# Altium integrated library ubloxLib.IntLib: 111 symbols (part 3 of 4) (continued)
## NORA-W40x (continued)
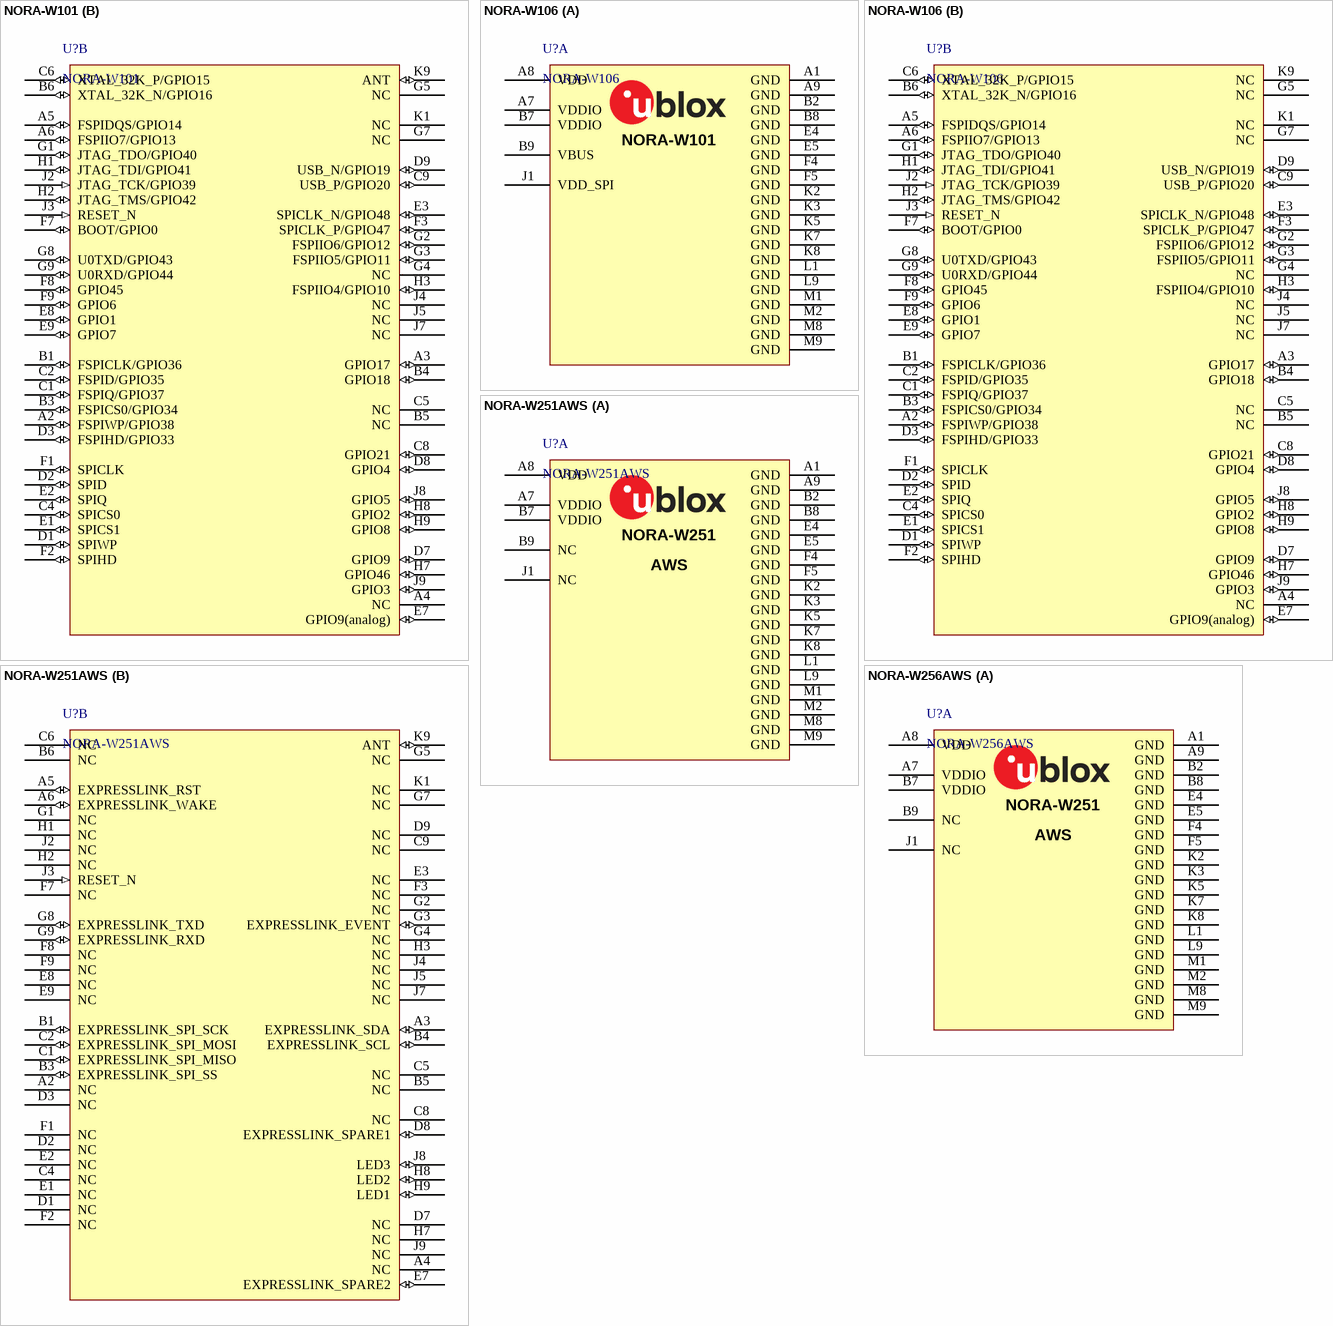
[diagram p17: symbols NORA-W101 to NORA-W256AWS]
text: NORA-MODULE

## NORA-W101
designator U?
u-blox NORA-W101 Bluetooth LE and Wi-Fi module - antenna pin; Manufacturer P/N: NORA-B101-00B; Part Number: NORA-B101; Part Description: Stand-alone Bluetooth low energy module - dual-core; Body Size: 14.3 mm x 10.4 mm; Part Name: NORA-B101; Part_Type: Module; Manufacturer: u-blox; Height: 1.8 mm; Value: NORA-W101
footprint NORA_LGA82R_1430X1040X190_PIN (NORA LGA, 82pin ,1.1mm Pitch, 14.3mm x 10.4mm x 1.9mm)
part A pins: A1 GND (power), A7 VDDIO (power), A8 VDD (power), A9 GND (power), B2 GND (power), B7 VDDIO (power), B8 GND (power), B9 VBUS (power), E4 GND (power), E5 GND (power), F4 GND (power), F5 GND (power), J1 VDD_SPI (power), K2 GND (power), K3 GND (power), K5 GND (power), K7 GND (power), K8 GND (power), L1 GND (power), L9 GND (power), M1 GND (power), M2 GND (power), M8 GND (power), M9 GND (power)
part B pins: A2 FSPIWP/GPIO38 (io), A3 GPIO17 (io), A4 NC, A5 FSPIDQS/GPIO14 (io), A6 FSPIIO7/GPIO13 (io), B1 FSPICLK/GPIO36 (io), B3 FSPICS0/GPIO34 (io), B4 GPIO18 (io), B5 NC, B6 XTAL_32K_N/GPIO16 (io), C1 FSPIQ/GPIO37 (io), C2 FSPID/GPIO35 (io), C4 SPICS0 (io), C5 NC, C6 XTAL_32K_P/GPIO15 (io), C8 GPIO21 (io), C9 USB_P/GPIO20 (io), D1 SPIWP (io), D2 SPID (io), D3 FSPIHD/GPIO33 (io), D7 GPIO9 (io), D8 GPIO4 (io), D9 USB_N/GPIO19 (io), E1 SPICS1 (io), E2 SPIQ (io), E3 SPICLK_N/GPIO48 (io), E7 GPIO9(analog) (io), E8 GPIO1 (io), E9 GPIO7 (io), F1 SPICLK (io), F2 SPIHD (io), F3 SPICLK_P/GPIO47 (io), F7 BOOT/GPIO0 (io), F8 GPIO45 (io), F9 GPIO6 (io), G1 JTAG_TDO/GPIO40 (io), G2 FSPIIO6/GPIO12 (io), G3 FSPIIO5/GPIO11 (io), G4 NC, G5 NC, G7 NC, G8 U0TXD/GPIO43 (io), G9 U0RXD/GPIO44 (io), H1 JTAG_TDI/GPIO41 (io), H2 JTAG_TMS/GPIO42 (io), H3 FSPIIO4/GPIO10 (io), H7 GPIO46 (io), H8 GPIO2 (io), H9 GPIO8 (io), J2 JTAG_TCK/GPIO39 (in), J3 RESET_N (in), J4 NC, J5 NC, J7 NC, J8 GPIO5 (io), J9 GPIO3 (io), K1 NC, K9 ANT (io)

## NORA-W106
designator U?
u-blox NORA-W106 Bluetooth LE and Wi-Fi module - PCB antenna; Manufacturer P/N: NORA-B101-00B; Part Number: NORA-B101; Part Description: Stand-alone Bluetooth low energy module - dual-core; Body Size: 14.3 mm x 10.4 mm; Value: NORA-W101; Part Name: NORA-B101; Part_Type: Module; Manufacturer: u-blox; Height: 1.8 mm
footprint NORA_LGA82R_1430X1040X190_ANT (NORA LGA, 82pin ,1.1mm Pitch, 14.3mm x 10.4mm x 1.9mm)
part A pins: A1 GND (power), A7 VDDIO (power), A8 VDD (power), A9 GND (power), B2 GND (power), B7 VDDIO (power), B8 GND (power), B9 VBUS (power), E4 GND (power), E5 GND (power), F4 GND (power), F5 GND (power), J1 VDD_SPI (power), K2 GND (power), K3 GND (power), K5 GND (power), K7 GND (power), K8 GND (power), L1 GND (power), L9 GND (power), M1 GND (power), M2 GND (power), M8 GND (power), M9 GND (power)
part B pins: A2 FSPIWP/GPIO38 (io), A3 GPIO17 (io), A4 NC, A5 FSPIDQS/GPIO14 (io), A6 FSPIIO7/GPIO13 (io), B1 FSPICLK/GPIO36 (io), B3 FSPICS0/GPIO34 (io), B4 GPIO18 (io), B5 NC, B6 XTAL_32K_N/GPIO16 (io), C1 FSPIQ/GPIO37 (io), C2 FSPID/GPIO35 (io), C4 SPICS0 (io), C5 NC, C6 XTAL_32K_P/GPIO15 (io), C8 GPIO21 (io), C9 USB_P/GPIO20 (io), D1 SPIWP (io), D2 SPID (io), D3 FSPIHD/GPIO33 (io), D7 GPIO9 (io), D8 GPIO4 (io), D9 USB_N/GPIO19 (io), E1 SPICS1 (io), E2 SPIQ (io), E3 SPICLK_N/GPIO48 (io), E7 GPIO9(analog) (io), E8 GPIO1 (io), E9 GPIO7 (io), F1 SPICLK (io), F2 SPIHD (io), F3 SPICLK_P/GPIO47 (io), F7 BOOT/GPIO0 (io), F8 GPIO45 (io), F9 GPIO6 (io), G1 JTAG_TDO/GPIO40 (io), G2 FSPIIO6/GPIO12 (io), G3 FSPIIO5/GPIO11 (io), G4 NC, G5 NC, G7 NC, G8 U0TXD/GPIO43 (io), G9 U0RXD/GPIO44 (io), H1 JTAG_TDI/GPIO41 (io), H2 JTAG_TMS/GPIO42 (io), H3 FSPIIO4/GPIO10 (io), H7 GPIO46 (io), H8 GPIO2 (io), H9 GPIO8 (io), J2 JTAG_TCK/GPIO39 (in), J3 RESET_N (in), J4 NC, J5 NC, J7 NC, J8 GPIO5 (io), J9 GPIO3 (io), K1 NC, K9 NC

## NORA-W251AWS
designator U?
u-blox NORA-W251AWS Bluetooth LE and Wi-Fi module - antenna pin; Manufacturer P/N: NORA-B101-00B; Part Number: NORA-B101; Part Description: Stand-alone Bluetooth low energy module - dual-core; Body Size: 14.3 mm x 10.4 mm; Value: NORA-W101; Part Name: NORA-B101; Part_Type: Module; Manufacturer: u-blox; Height: 1.8 mm
footprint NORA_LGA82R_1430X1040X190_PIN (NORA LGA, 82pin ,1.1mm Pitch, 14.3mm x 10.4mm x 1.9mm)
part A pins: A1 GND (power), A7 VDDIO (power), A8 VDD (power), A9 GND (power), B2 GND (power), B7 VDDIO (power), B8 GND (power), B9 NC, E4 GND (power), E5 GND (power), F4 GND (power), F5 GND (power), J1 NC, K2 GND (power), K3 GND (power), K5 GND (power), K7 GND (power), K8 GND (power), L1 GND (power), L9 GND (power), M1 GND (power), M2 GND (power), M8 GND (power), M9 GND (power)
part B pins: A2 NC, A3 EXPRESSLINK_SDA (io), A4 NC, A5 EXPRESSLINK_RST (io), A6 EXPRESSLINK_WAKE (io), B1 EXPRESSLINK_SPI_SCK (io), B3 EXPRESSLINK_SPI_SS (io), B4 EXPRESSLINK_SCL (io), B5 NC, B6 NC, C1 EXPRESSLINK_SPI_MISO (io), C2 EXPRESSLINK_SPI_MOSI (io), C4 NC, C5 NC, C6 NC, C8 NC, C9 NC, D1 NC, D2 NC, D3 NC, D7 NC, D8 EXPRESSLINK_SPARE1 (io), D9 NC, E1 NC, E2 NC, E3 NC, E7 EXPRESSLINK_SPARE2 (io), E8 NC, E9 NC, F1 NC, F2 NC, F3 NC, F7 NC, F8 NC, F9 NC, G1 NC, G2 NC, G3 EXPRESSLINK_EVENT (io), G4 NC, G5 NC, G7 NC, G8 EXPRESSLINK_TXD (io), G9 EXPRESSLINK_RXD (io), H1 NC, H2 NC, H3 NC, H7 NC, H8 LED2 (io), H9 LED1 (io), J2 NC, J3 RESET_N (in), J4 NC, J5 NC, J7 NC, J8 LED3 (io), J9 NC, K1 NC, K9 ANT (io)
part A text: NORA-W251; AWS

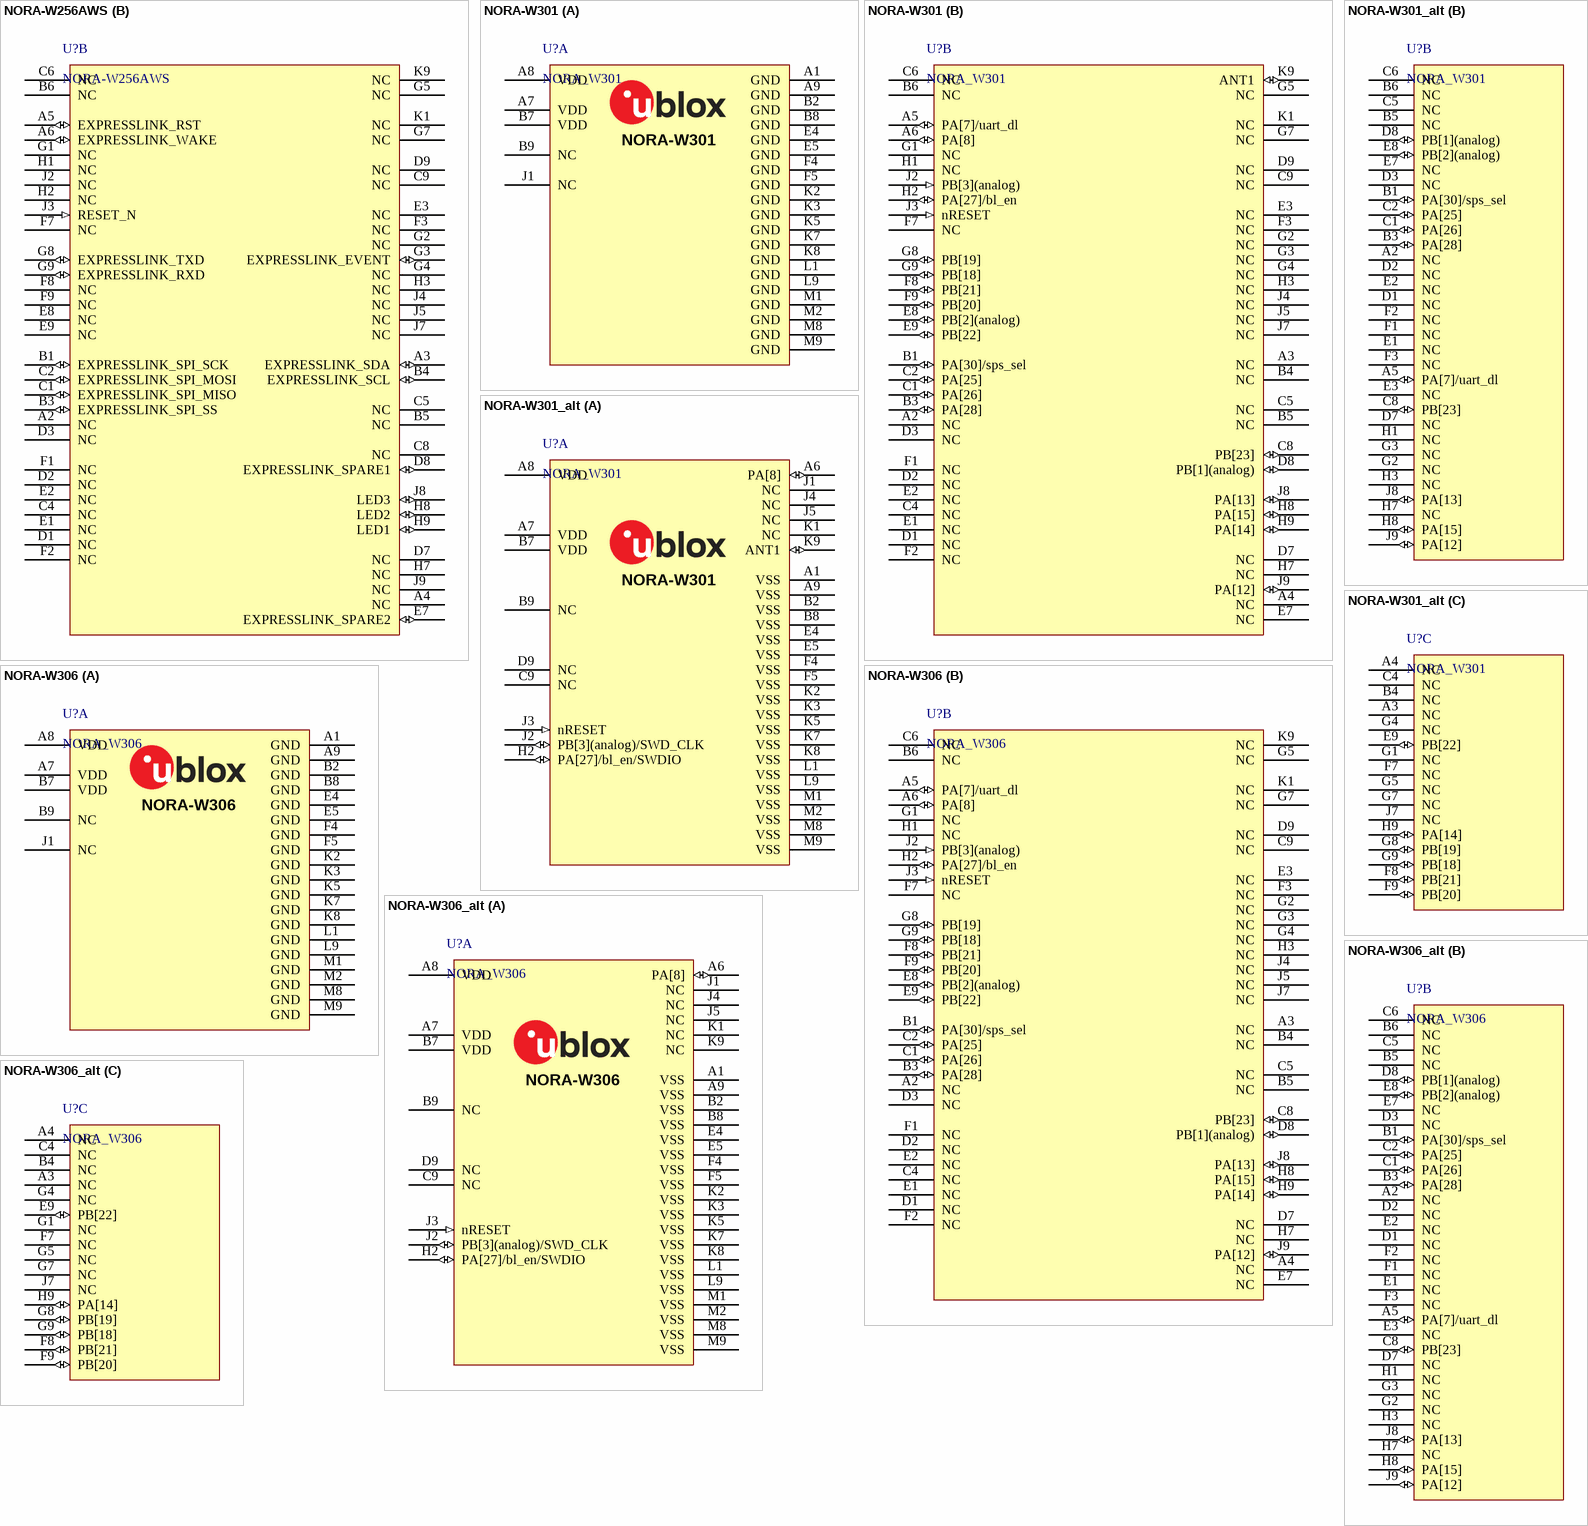
[diagram p18: symbols NORA-W256AWS to NORA-W306_alt]

## NORA-W256AWS
designator U?
u-blox NORA-W256AWS Bluetooth LE and Wi-Fi module - PCB antenna; Manufacturer P/N: NORA-B101-00B; Part Number: NORA-B101; Part Description: Stand-alone Bluetooth low energy module - dual-core; Body Size: 14.3 mm x 10.4 mm; Value: NORA-W101; Part Name: NORA-B101; Part_Type: Module; Manufacturer: u-blox; Height: 1.8 mm
footprint NORA_LGA82R_1430X1040X190_ANT (NORA LGA, 82pin ,1.1mm Pitch, 14.3mm x 10.4mm x 1.9mm)
part A pins: A1 GND (power), A7 VDDIO (power), A8 VDD (power), A9 GND (power), B2 GND (power), B7 VDDIO (power), B8 GND (power), B9 NC, E4 GND (power), E5 GND (power), F4 GND (power), F5 GND (power), J1 NC, K2 GND (power), K3 GND (power), K5 GND (power), K7 GND (power), K8 GND (power), L1 GND (power), L9 GND (power), M1 GND (power), M2 GND (power), M8 GND (power), M9 GND (power)
part B pins: A2 NC, A3 EXPRESSLINK_SDA (io), A4 NC, A5 EXPRESSLINK_RST (io), A6 EXPRESSLINK_WAKE (io), B1 EXPRESSLINK_SPI_SCK (io), B3 EXPRESSLINK_SPI_SS (io), B4 EXPRESSLINK_SCL (io), B5 NC, B6 NC, C1 EXPRESSLINK_SPI_MISO (io), C2 EXPRESSLINK_SPI_MOSI (io), C4 NC, C5 NC, C6 NC, C8 NC, C9 NC, D1 NC, D2 NC, D3 NC, D7 NC, D8 EXPRESSLINK_SPARE1 (io), D9 NC, E1 NC, E2 NC, E3 NC, E7 EXPRESSLINK_SPARE2 (io), E8 NC, E9 NC, F1 NC, F2 NC, F3 NC, F7 NC, F8 NC, F9 NC, G1 NC, G2 NC, G3 EXPRESSLINK_EVENT (io), G4 NC, G5 NC, G7 NC, G8 EXPRESSLINK_TXD (io), G9 EXPRESSLINK_RXD (io), H1 NC, H2 NC, H3 NC, H7 NC, H8 LED2 (io), H9 LED1 (io), J2 NC, J3 RESET_N (in), J4 NC, J5 NC, J7 NC, J8 LED3 (io), J9 NC, K1 NC, K9 NC
part A text: NORA-W251; AWS

## NORA-W301
designator U?, comment NORA_W301
u-blox NORA-W301 Bluetooth LE and Wi-Fi module - antenna pin; Manufacturer P/N: NORA-B101-00B; Part Number: NORA-B101; Part Description: Stand-alone Bluetooth low energy module - dual-core; Body Size: 14.3 mm x 10.4 mm; Value: NORA-W101; Part Name: NORA-B101; Part_Type: Module; Manufacturer: u-blox; Height: 1.8 mm
footprint NORA_LGA82R_1430X1040X190_W3_PIN (NORA LGA, 82pin ,1.1mm Pitch, 14.3mm x 10.4mm)
part A pins: A1 GND (power), A7 VDD (power), A8 VDD (power), A9 GND (power), B2 GND (power), B7 VDD (power), B8 GND (power), B9 NC, E4 GND (power), E5 GND (power), F4 GND (power), F5 GND (power), J1 NC, K2 GND (power), K3 GND (power), K5 GND (power), K7 GND (power), K8 GND (power), L1 GND (power), L9 GND (power), M1 GND (power), M2 GND (power), M8 GND (power), M9 GND (power)
part B pins: A2 NC, A3 NC, A4 NC, A5 PA[7]/uart_dl (io), A6 PA[8] (io), B1 PA[30]/sps_sel (io), B3 PA[28] (io), B4 NC, B5 NC, B6 NC, C1 PA[26] (io), C2 PA[25] (io), C4 NC, C5 NC, C6 NC, C8 PB[23] (io), C9 NC, D1 NC, D2 NC, D3 NC, D7 NC, D8 PB[1](analog) (io), D9 NC, E1 NC, E2 NC, E3 NC, E7 NC, E8 PB[2](analog) (io), E9 PB[22] (io), F1 NC, F2 NC, F3 NC, F7 NC, F8 PB[21] (io), F9 PB[20] (io), G1 NC, G2 NC, G3 NC, G4 NC, G5 NC, G7 NC, G8 PB[19] (io), G9 PB[18] (io), H1 NC, H2 PA[27]/bl_en (io), H3 NC, H7 NC, H8 PA[15] (io), H9 PA[14] (io), J2 PB[3](analog) (in), J3 nRESET (in), J4 NC, J5 NC, J7 NC, J8 PA[13] (io), J9 PA[12] (io), K1 NC, K9 ANT1 (io)

## NORA-W301_alt
designator U?, comment NORA_W301
u-blox NORA-W301 Bluetooth LE and Wi-Fi module - antenna pin; Manufacturer P/N: NORA-B101-00B; Part Number: NORA-B101; Part Description: Stand-alone Bluetooth low energy module - dual-core; Body Size: 14.3 mm x 10.4 mm; Value: NORA-W101; Part Name: NORA-B101; Part_Type: Module; Manufacturer: u-blox; Height: 1.8 mm
footprint NORA_LGA82R_1430X1040X190_W3_PIN (NORA LGA, 82pin ,1.1mm Pitch, 14.3mm x 10.4mm)
part A pins: A1 VSS (power), A6 PA[8] (io), A7 VDD (power), A8 VDD (power), A9 VSS (power), B2 VSS (power), B7 VDD (power), B8 VSS (power), B9 NC, C9 NC (hiz), D9 NC (hiz), E4 VSS (power), E5 VSS (power), F4 VSS (power), F5 VSS (power), H2 PA[27]/bl_en/SWDIO (io), J1 NC (hiz), J2 PB[3](analog)/SWD_CLK (io), J3 nRESET (in), J4 NC (hiz), J5 NC (hiz), K1 NC (hiz), K2 VSS (power), K3 VSS (power), K5 VSS (power), K7 VSS (power), K8 VSS (power), K9 ANT1 (io), L1 VSS (power), L9 VSS (power), M1 VSS (power), M2 VSS (power), M8 VSS (power), M9 VSS (power)
part B pins: A2 NC (hiz), A5 PA[7]/uart_dl (io), B1 PA[30]/sps_sel (io), B3 PA[28] (io), B5 NC (hiz), B6 NC (hiz), C1 PA[26] (io), C2 PA[25] (io), C5 NC (hiz), C6 NC (hiz), C8 PB[23] (io), D1 NC (hiz), D2 NC (hiz), D3 NC (hiz), D7 NC (hiz), D8 PB[1](analog) (io), E1 NC (hiz), E2 NC (hiz), E3 NC (hiz), E7 NC (hiz), E8 PB[2](analog) (io), F1 NC (hiz), F2 NC (hiz), F3 NC (hiz), G2 NC (hiz), G3 NC (hiz), H1 NC (hiz), H3 NC (hiz), H7 NC (hiz), H8 PA[15] (io), J8 PA[13] (io), J9 PA[12] (io)
part C pins: A3 NC (hiz), A4 NC (hiz), B4 NC (hiz), C4 NC (hiz), E9 PB[22] (io), F7 NC (hiz), F8 PB[21] (io), F9 PB[20] (io), G1 NC (hiz), G4 NC (hiz), G5 NC (hiz), G7 NC (hiz), G8 PB[19] (io), G9 PB[18] (io), H9 PA[14] (io), J7 NC (hiz)
part A text: NORA-W301

## NORA-W306
designator U?, comment NORA_W306
u-blox NORA-W306 Bluetooth LE and Wi-Fi module - antenna pin; Manufacturer P/N: NORA-B101-00B; Part Number: NORA-B101; Part Description: Stand-alone Bluetooth low energy module - dual-core; Body Size: 14.3 mm x 10.4 mm; Value: NORA-W101; Part Name: NORA-B101; Part_Type: Module; Manufacturer: u-blox; Height: 1.8 mm
footprint NORA_LGA82R_1430X1040X190_W3_ANT (NORA LGA, 82pin ,1.1mm Pitch, 14.3mm x 10.4mm)
part A pins: A1 GND (power), A7 VDD (power), A8 VDD (power), A9 GND (power), B2 GND (power), B7 VDD (power), B8 GND (power), B9 NC, E4 GND (power), E5 GND (power), F4 GND (power), F5 GND (power), J1 NC, K2 GND (power), K3 GND (power), K5 GND (power), K7 GND (power), K8 GND (power), L1 GND (power), L9 GND (power), M1 GND (power), M2 GND (power), M8 GND (power), M9 GND (power)
part B pins: A2 NC, A3 NC, A4 NC, A5 PA[7]/uart_dl (io), A6 PA[8] (io), B1 PA[30]/sps_sel (io), B3 PA[28] (io), B4 NC, B5 NC, B6 NC, C1 PA[26] (io), C2 PA[25] (io), C4 NC, C5 NC, C6 NC, C8 PB[23] (io), C9 NC, D1 NC, D2 NC, D3 NC, D7 NC, D8 PB[1](analog) (io), D9 NC, E1 NC, E2 NC, E3 NC, E7 NC, E8 PB[2](analog) (io), E9 PB[22] (io), F1 NC, F2 NC, F3 NC, F7 NC, F8 PB[21] (io), F9 PB[20] (io), G1 NC, G2 NC, G3 NC, G4 NC, G5 NC, G7 NC, G8 PB[19] (io), G9 PB[18] (io), H1 NC, H2 PA[27]/bl_en (io), H3 NC, H7 NC, H8 PA[15] (io), H9 PA[14] (io), J2 PB[3](analog) (in), J3 nRESET (in), J4 NC, J5 NC, J7 NC, J8 PA[13] (io), J9 PA[12] (io), K1 NC, K9 NC

## NORA-W306_alt
designator U?, comment NORA_W306
u-blox NORA-W306 Bluetooth LE and Wi-Fi module - antenna pin; Manufacturer P/N: NORA-B101-00B; Part Number: NORA-B101; Part Description: Stand-alone Bluetooth low energy module - dual-core; Body Size: 14.3 mm x 10.4 mm; Value: NORA-W101; Part Name: NORA-B101; Part_Type: Module; Manufacturer: u-blox; Height: 1.8 mm
footprint NORA_LGA82R_1430X1040X190_W3_ANT (NORA LGA, 82pin ,1.1mm Pitch, 14.3mm x 10.4mm)
part A pins: A1 VSS (power), A6 PA[8] (io), A7 VDD (power), A8 VDD (power), A9 VSS (power), B2 VSS (power), B7 VDD (power), B8 VSS (power), B9 NC, C9 NC (hiz), D9 NC (hiz), E4 VSS (power), E5 VSS (power), F4 VSS (power), F5 VSS (power), H2 PA[27]/bl_en/SWDIO (io), J1 NC (hiz), J2 PB[3](analog)/SWD_CLK (io), J3 nRESET (in), J4 NC (hiz), J5 NC (hiz), K1 NC (hiz), K2 VSS (power), K3 VSS (power), K5 VSS (power), K7 VSS (power), K8 VSS (power), K9 NC (hiz), L1 VSS (power), L9 VSS (power), M1 VSS (power), M2 VSS (power), M8 VSS (power), M9 VSS (power)
part B pins: A2 NC (hiz), A5 PA[7]/uart_dl (io), B1 PA[30]/sps_sel (io), B3 PA[28] (io), B5 NC (hiz), B6 NC (hiz), C1 PA[26] (io), C2 PA[25] (io), C5 NC (hiz), C6 NC (hiz), C8 PB[23] (io), D1 NC (hiz), D2 NC (hiz), D3 NC (hiz), D7 NC (hiz), D8 PB[1](analog) (io), E1 NC (hiz), E2 NC (hiz), E3 NC (hiz), E7 NC (hiz), E8 PB[2](analog) (io), F1 NC (hiz), F2 NC (hiz), F3 NC (hiz), G2 NC (hiz), G3 NC (hiz), H1 NC (hiz), H3 NC (hiz), H7 NC (hiz), H8 PA[15] (io), J8 PA[13] (io), J9 PA[12] (io)
part C pins: A3 NC (hiz), A4 NC (hiz), B4 NC (hiz), C4 NC (hiz), E9 PB[22] (io), F7 NC (hiz), F8 PB[21] (io), F9 PB[20] (io), G1 NC (hiz), G4 NC (hiz), G5 NC (hiz), G7 NC (hiz), G8 PB[19] (io), G9 PB[18] (io), H9 PA[14] (io), J7 NC (hiz)
part A text: NORA-W306

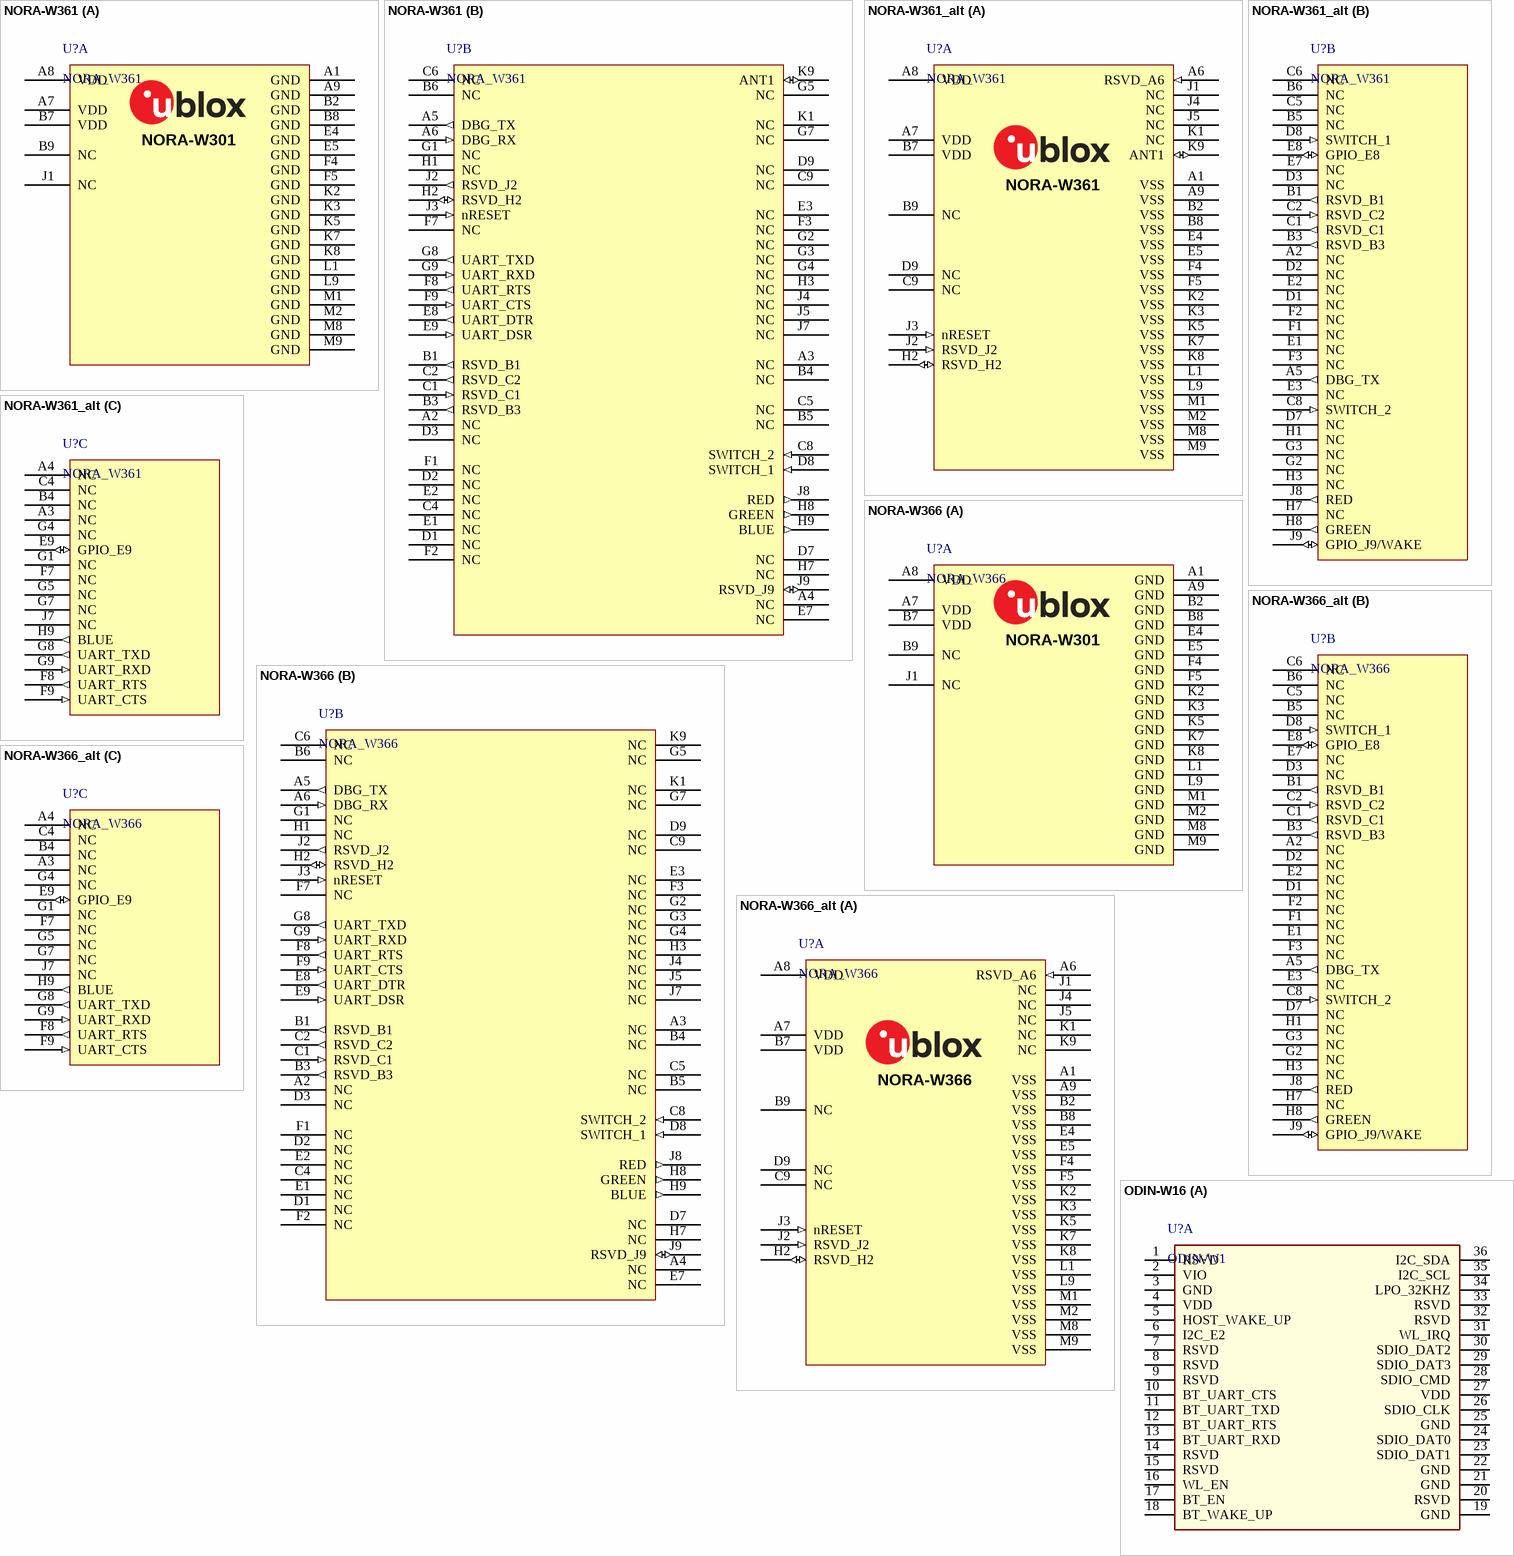
[diagram p19: symbols NORA-W361 to ODIN-W16]

## NORA-W361
designator U?, comment NORA_W361
u-blox NORA-W361 Bluetooth LE and Wi-Fi module - antenna pin; Manufacturer P/N: NORA-B101-00B; Part Number: NORA-B101; Part Description: Stand-alone Bluetooth low energy module - dual-core; Body Size: 14.3 mm x 10.4 mm; Value: NORA-W101; Part Name: NORA-B101; Part_Type: Module; Manufacturer: u-blox; Height: 1.8 mm
footprint NORA_LGA82R_1430X1040X190_W3_PIN (NORA LGA, 82pin ,1.1mm Pitch, 14.3mm x 10.4mm)
part A pins: A1 GND (power), A7 VDD (power), A8 VDD (power), A9 GND (power), B2 GND (power), B7 VDD (power), B8 GND (power), B9 NC, E4 GND (power), E5 GND (power), F4 GND (power), F5 GND (power), J1 NC, K2 GND (power), K3 GND (power), K5 GND (power), K7 GND (power), K8 GND (power), L1 GND (power), L9 GND (power), M1 GND (power), M2 GND (power), M8 GND (power), M9 GND (power)
part B pins: A2 NC, A3 NC, A4 NC, A5 DBG_TX (out), A6 DBG_RX (in), B1 RSVD_B1 (out), B3 RSVD_B3 (out), B4 NC, B5 NC, B6 NC, C1 RSVD_C1 (in), C2 RSVD_C2 (out), C4 NC, C5 NC, C6 NC, C8 SWITCH_2 (in), C9 NC, D1 NC, D2 NC, D3 NC, D7 NC, D8 SWITCH_1 (in), D9 NC, E1 NC, E2 NC, E3 NC, E7 NC, E8 UART_DTR (out), E9 UART_DSR (in), F1 NC, F2 NC, F3 NC, F7 NC, F8 UART_RTS (out), F9 UART_CTS (in), G1 NC, G2 NC, G3 NC, G4 NC, G5 NC, G7 NC, G8 UART_TXD (out), G9 UART_RXD (in), H1 NC, H2 RSVD_H2 (io), H3 NC, H7 NC, H8 GREEN (out), H9 BLUE (out), J2 RSVD_J2 (out), J3 nRESET (in), J4 NC, J5 NC, J7 NC, J8 RED (out), J9 RSVD_J9 (io), K1 NC, K9 ANT1 (io)
part A text: NORA-W301

## NORA-W361_alt
designator U?, comment NORA_W361
u-blox NORA-W361 Bluetooth LE and Wi-Fi module - antenna pin; Manufacturer P/N: NORA-B101-00B; Part Number: NORA-B101; Part Description: Stand-alone Bluetooth low energy module - dual-core; Body Size: 14.3 mm x 10.4 mm; Value: NORA-W101; Part Name: NORA-B101; Part_Type: Module; Manufacturer: u-blox; Height: 1.8 mm
footprint NORA_LGA82R_1430X1040X190_W3_PIN (NORA LGA, 82pin ,1.1mm Pitch, 14.3mm x 10.4mm)
part A pins: A1 VSS (power), A6 RSVD_A6 (in), A7 VDD (power), A8 VDD (power), A9 VSS (power), B2 VSS (power), B7 VDD (power), B8 VSS (power), B9 NC, C9 NC (hiz), D9 NC (hiz), E4 VSS (power), E5 VSS (power), F4 VSS (power), F5 VSS (power), H2 RSVD_H2 (io), J1 NC (hiz), J2 RSVD_J2 (in), J3 nRESET (in), J4 NC (hiz), J5 NC (hiz), K1 NC (hiz), K2 VSS (power), K3 VSS (power), K5 VSS (power), K7 VSS (power), K8 VSS (power), K9 ANT1 (io), L1 VSS (power), L9 VSS (power), M1 VSS (power), M2 VSS (power), M8 VSS (power), M9 VSS (power)
part B pins: A2 NC (hiz), A5 DBG_TX (out), B1 RSVD_B1 (out), B3 RSVD_B3 (out), B5 NC (hiz), B6 NC (hiz), C1 RSVD_C1 (out), C2 RSVD_C2 (in), C5 NC (hiz), C6 NC (hiz), C8 SWITCH_2 (in), D1 NC (hiz), D2 NC (hiz), D3 NC (hiz), D7 NC (hiz), D8 SWITCH_1 (in), E1 NC (hiz), E2 NC (hiz), E3 NC (hiz), E7 NC (hiz), E8 GPIO_E8 (io), F1 NC (hiz), F2 NC (hiz), F3 NC (hiz), G2 NC (hiz), G3 NC (hiz), H1 NC (hiz), H3 NC (hiz), H7 NC (hiz), H8 GREEN (out), J8 RED (out), J9 GPIO_J9/WAKE (io)
part C pins: A3 NC (hiz), A4 NC (hiz), B4 NC (hiz), C4 NC (hiz), E9 GPIO_E9 (io), F7 NC (hiz), F8 UART_RTS (out), F9 UART_CTS (in), G1 NC (hiz), G4 NC (hiz), G5 NC (hiz), G7 NC (hiz), G8 UART_TXD (out), G9 UART_RXD (in), H9 BLUE (out), J7 NC (hiz)
part A text: NORA-W361

## NORA-W366
designator U?, comment NORA_W366
u-blox NORA-W366 Bluetooth LE and Wi-Fi module - PCB antenna; Manufacturer P/N: NORA-B101-00B; Part Number: NORA-B101; Part Description: Stand-alone Bluetooth low energy module - dual-core; Body Size: 14.3 mm x 10.4 mm; Value: NORA-W101; Part Name: NORA-B101; Part_Type: Module; Manufacturer: u-blox; Height: 1.8 mm
footprint NORA_LGA82R_1430X1040X190_W3_ANT (NORA LGA, 82pin ,1.1mm Pitch, 14.3mm x 10.4mm)
part A pins: A1 GND (power), A7 VDD (power), A8 VDD (power), A9 GND (power), B2 GND (power), B7 VDD (power), B8 GND (power), B9 NC, E4 GND (power), E5 GND (power), F4 GND (power), F5 GND (power), J1 NC, K2 GND (power), K3 GND (power), K5 GND (power), K7 GND (power), K8 GND (power), L1 GND (power), L9 GND (power), M1 GND (power), M2 GND (power), M8 GND (power), M9 GND (power)
part B pins: A2 NC, A3 NC, A4 NC, A5 DBG_TX (out), A6 DBG_RX (in), B1 RSVD_B1 (out), B3 RSVD_B3 (out), B4 NC, B5 NC, B6 NC, C1 RSVD_C1 (in), C2 RSVD_C2 (out), C4 NC, C5 NC, C6 NC, C8 SWITCH_2 (in), C9 NC, D1 NC, D2 NC, D3 NC, D7 NC, D8 SWITCH_1 (in), D9 NC, E1 NC, E2 NC, E3 NC, E7 NC, E8 UART_DTR (out), E9 UART_DSR (in), F1 NC, F2 NC, F3 NC, F7 NC, F8 UART_RTS (out), F9 UART_CTS (in), G1 NC, G2 NC, G3 NC, G4 NC, G5 NC, G7 NC, G8 UART_TXD (out), G9 UART_RXD (in), H1 NC, H2 RSVD_H2 (io), H3 NC, H7 NC, H8 GREEN (out), H9 BLUE (out), J2 RSVD_J2 (out), J3 nRESET (in), J4 NC, J5 NC, J7 NC, J8 RED (out), J9 RSVD_J9 (io), K1 NC, K9 NC (hiz)
part A text: NORA-W301

## NORA-W366_alt
designator U?, comment NORA_W366
u-blox NORA-W361 Bluetooth LE and Wi-Fi module - antenna pin; Manufacturer P/N: NORA-B101-00B; Part Number: NORA-B101; Part Description: Stand-alone Bluetooth low energy module - dual-core; Body Size: 14.3 mm x 10.4 mm; Value: NORA-W101; Part Name: NORA-B101; Part_Type: Module; Manufacturer: u-blox; Height: 1.8 mm
footprint NORA_LGA82R_1430X1040X190_W3_ANT (NORA LGA, 82pin ,1.1mm Pitch, 14.3mm x 10.4mm)
part A pins: A1 VSS (power), A6 RSVD_A6 (in), A7 VDD (power), A8 VDD (power), A9 VSS (power), B2 VSS (power), B7 VDD (power), B8 VSS (power), B9 NC, C9 NC (hiz), D9 NC (hiz), E4 VSS (power), E5 VSS (power), F4 VSS (power), F5 VSS (power), H2 RSVD_H2 (io), J1 NC (hiz), J2 RSVD_J2 (in), J3 nRESET (in), J4 NC (hiz), J5 NC (hiz), K1 NC (hiz), K2 VSS (power), K3 VSS (power), K5 VSS (power), K7 VSS (power), K8 VSS (power), K9 NC (hiz), L1 VSS (power), L9 VSS (power), M1 VSS (power), M2 VSS (power), M8 VSS (power), M9 VSS (power)
part B pins: A2 NC (hiz), A5 DBG_TX (out), B1 RSVD_B1 (out), B3 RSVD_B3 (out), B5 NC (hiz), B6 NC (hiz), C1 RSVD_C1 (out), C2 RSVD_C2 (in), C5 NC (hiz), C6 NC (hiz), C8 SWITCH_2 (in), D1 NC (hiz), D2 NC (hiz), D3 NC (hiz), D7 NC (hiz), D8 SWITCH_1 (in), E1 NC (hiz), E2 NC (hiz), E3 NC (hiz), E7 NC (hiz), E8 GPIO_E8 (io), F1 NC (hiz), F2 NC (hiz), F3 NC (hiz), G2 NC (hiz), G3 NC (hiz), H1 NC (hiz), H3 NC (hiz), H7 NC (hiz), H8 GREEN (out), J8 RED (out), J9 GPIO_J9/WAKE (io)
part C pins: A3 NC (hiz), A4 NC (hiz), B4 NC (hiz), C4 NC (hiz), E9 GPIO_E9 (io), F7 NC (hiz), F8 UART_RTS (out), F9 UART_CTS (in), G1 NC (hiz), G4 NC (hiz), G5 NC (hiz), G7 NC (hiz), G8 UART_TXD (out), G9 UART_RXD (in), H9 BLUE (out), J7 NC (hiz)
part A text: NORA-W366

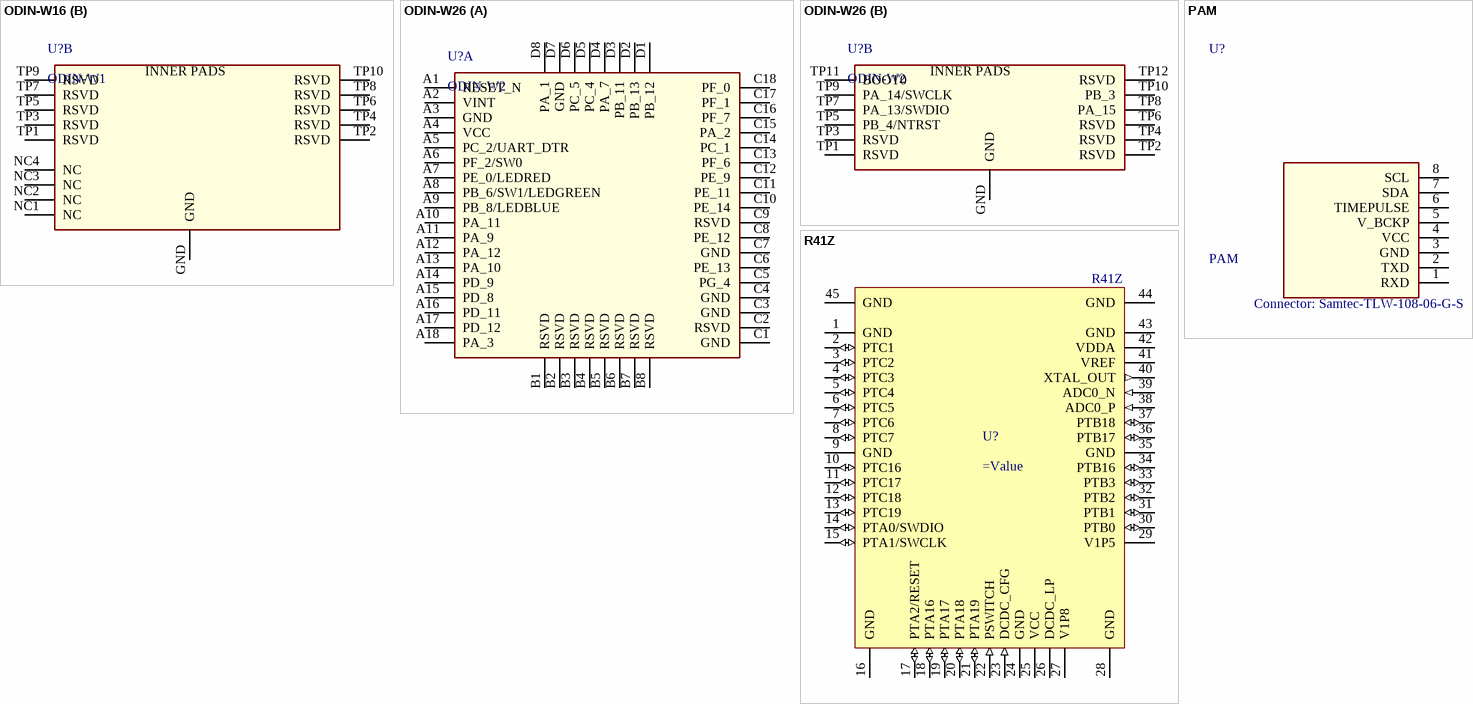
[diagram p20: symbols ODIN-W16 to R41Z]

## ODIN-W16
designator U?, comment ODIN-W1
u-blox ODIN-W16 host-based multiradio module with Wi-Fi and Bluetooth; Manufacturer: u-blox; Part Description: Host-based multiradio module with Wi-Fi and Bluetooth; Value: ODIN-W1
footprint ODIN-W16 (ODIN-W16 WiFi/BT module)
part A pins: 1 RSVD, 2 VIO, 3 GND, 4 VDD, 5 HOST_WAKE_UP, 6 I2C_E2, 7 RSVD, 8 RSVD, 9 RSVD, 10 BT_UART_CTS, 11 BT_UART_TXD, 12 BT_UART_RTS, 13 BT_UART_RXD, 14 RSVD, 15 RSVD, 16 WL_EN, 17 BT_EN, 18 BT_WAKE_UP, 19 GND, 20 RSVD, 21 GND, 22 GND, 23 SDIO_DAT1, 24 SDIO_DAT0, 25 GND, 26 SDIO_CLK, 27 VDD, 28 SDIO_CMD, 29 SDIO_DAT3, 30 SDIO_DAT2, 31 WL_IRQ, 32 RSVD, 33 RSVD, 34 LPO_32KHZ, 35 I2C_SCL, 36 I2C_SDA
part B pins: GND, NC1 NC, NC2 NC, NC3 NC, NC4 NC, TP1 RSVD, TP2 RSVD, TP3 RSVD, TP4 RSVD, TP5 RSVD, TP6 RSVD, TP7 RSVD, TP8 RSVD, TP9 RSVD, TP10 RSVD
1 alternate drawing of the same symbol
part B text: INNER PADS

## ODIN-W26
designator U?, comment ODIN-W2
u-blox ODIN-W26 host-based multiradio module with Wi-Fi and Bluetooth; Part Description: Stand-alone multiradio module with Wi-Fi & Bluetooth; Manufacturer: u-blox; Value: ODIN-W2
footprint ODIN-W26 (ODIN-W262 WiFi/BT  module)
part A pins: A1 RESET_N, A2 VINT, A3 GND, A4 VCC, A5 PC_2/UART_DTR, A6 PF_2/SW0, A7 PE_0/LEDRED, A8 PB_6/SW1/LEDGREEN, A9 PB_8/LEDBLUE, A10 PA_11, A11 PA_9, A12 PA_12, A13 PA_10, A14 PD_9, A15 PD_8, A16 PD_11, A17 PD_12, A18 PA_3, B1 RSVD, B2 RSVD, B3 RSVD, B4 RSVD, B5 RSVD, B6 RSVD, B7 RSVD, B8 RSVD, C1 GND, C2 RSVD, C3 GND, C4 GND, C5 PG_4, C6 PE_13, C7 GND, C8 PE_12, C9 RSVD, C10 PE_14, C11 PE_11, C12 PE_9, C13 PF_6, C14 PC_1, C15 PA_2, C16 PF_7, C17 PF_1, C18 PF_0, D1 PB_12, D2 PB_13, D3 PB_11, D4 PA_7, D5 PC_4, D6 PC_5, D7 GND, D8 PA_1
part B pins: GND, TP1 RSVD, TP2 RSVD, TP3 RSVD, TP4 RSVD, TP5 PB_4/NTRST, TP6 RSVD, TP7 PA_13/SWDIO, TP8 PA_15, TP9 PA_14/SWCLK, TP10 PB_3, TP11 BOOT0, TP12 RSVD
part B text: INNER PADS

## PAM
designator U?  Connector: Samtec-TLW-108-06-G-S
u-blox PAM GNSS antenna module; Manufacturer: u-blox; Part Description: u-blox PAM GNSS antenna module; Value: PAM
footprint PAM (u-blox PAM antenna module)
pins: 1 RXD, 2 TXD, 3 GND, 4 VCC, 5 V_BCKP, 6 TIMEPULSE, 7 SDA, 8 SCL

## R41Z
designator U?  Part Number: R41Z
u-blox R41Z Bluetooth 4.2 LE, 802.15.4 module; Manufacturer P/N: R41Z-TA-R; Body Size: 15.2mmx10.6mm; Internal Antenna: Yes; RF Protocol: BT 4.2 LE, 802.15.4, 2.4GHz Proprietary; Height: 2.1mm; Manufacturer: u-blox
footprint R41Z_LGA45S_1620X1060X210_PCB (LGA, 45pin, 1.1mm Pitch, 1.2mm x 10.6mm)
pins: 1 GND (power), 2 PTC1 (io), 3 PTC2 (io), 4 PTC3 (io), 5 PTC4 (io), 6 PTC5 (io), 7 PTC6 (io), 8 PTC7 (io), 9 GND (power), 10 PTC16 (io), 11 PTC17 (io), 12 PTC18 (io), 13 PTC19 (io), 14 PTA0/SWDIO (io), 15 PTA1/SWCLK (io), 16 GND (power), 17 PTA2/RESET (io), 18 PTA16 (io), 19 PTA17 (io), 20 PTA18 (io), 21 PTA19 (io), 22 PSWITCH (in), 23 DCDC_CFG (in), 24 GND (power), 25 VCC (power), 26 DCDC_LP (power), 27 V1P8 (power), 28 GND (power), 29 V1P5 (power), 30 PTB0 (io), 31 PTB1 (io), 32 PTB2 (io), 33 PTB3 (io), 34 PTB16 (io), 35 GND (power), 36 PTB17 (io), 37 PTB18 (io), 38 ADC0_P (in), 39 ADC0_N (in), 40 XTAL_OUT (out), 41 VREF (power), 42 VDDA (power), 43 GND (power), 44 GND (power), 45 GND (power)

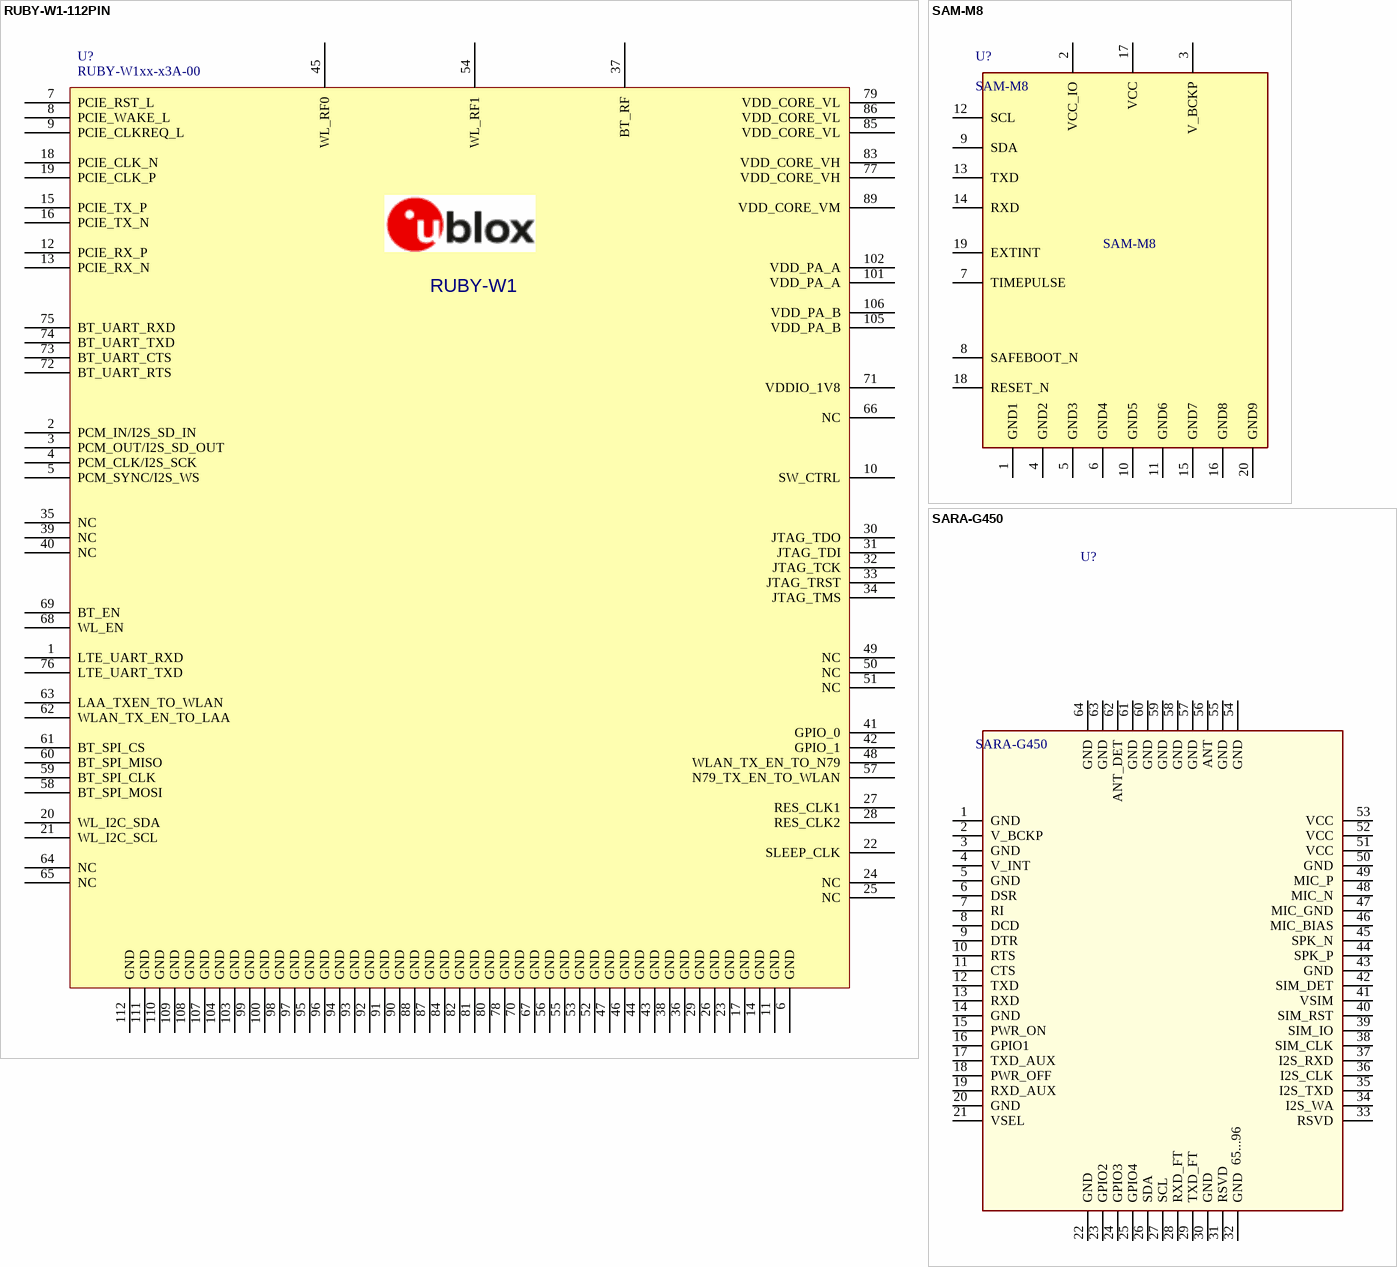
[diagram p21: symbols RUBY-W1-112PIN to SARA-G450]